# Altium footprint library base.PcbLib: 116 footprints (part 2 of 8)
Each footprint in its own frame and in the unit in brackets; x right, y up, seen from the top. Pads: shape width x height; smd on the part's side, far side on the other; paste and mask are expansions set on the pad; w line width, h text height; cw(c..) or ccw(c..) is an arc to the next point about the centre after c.
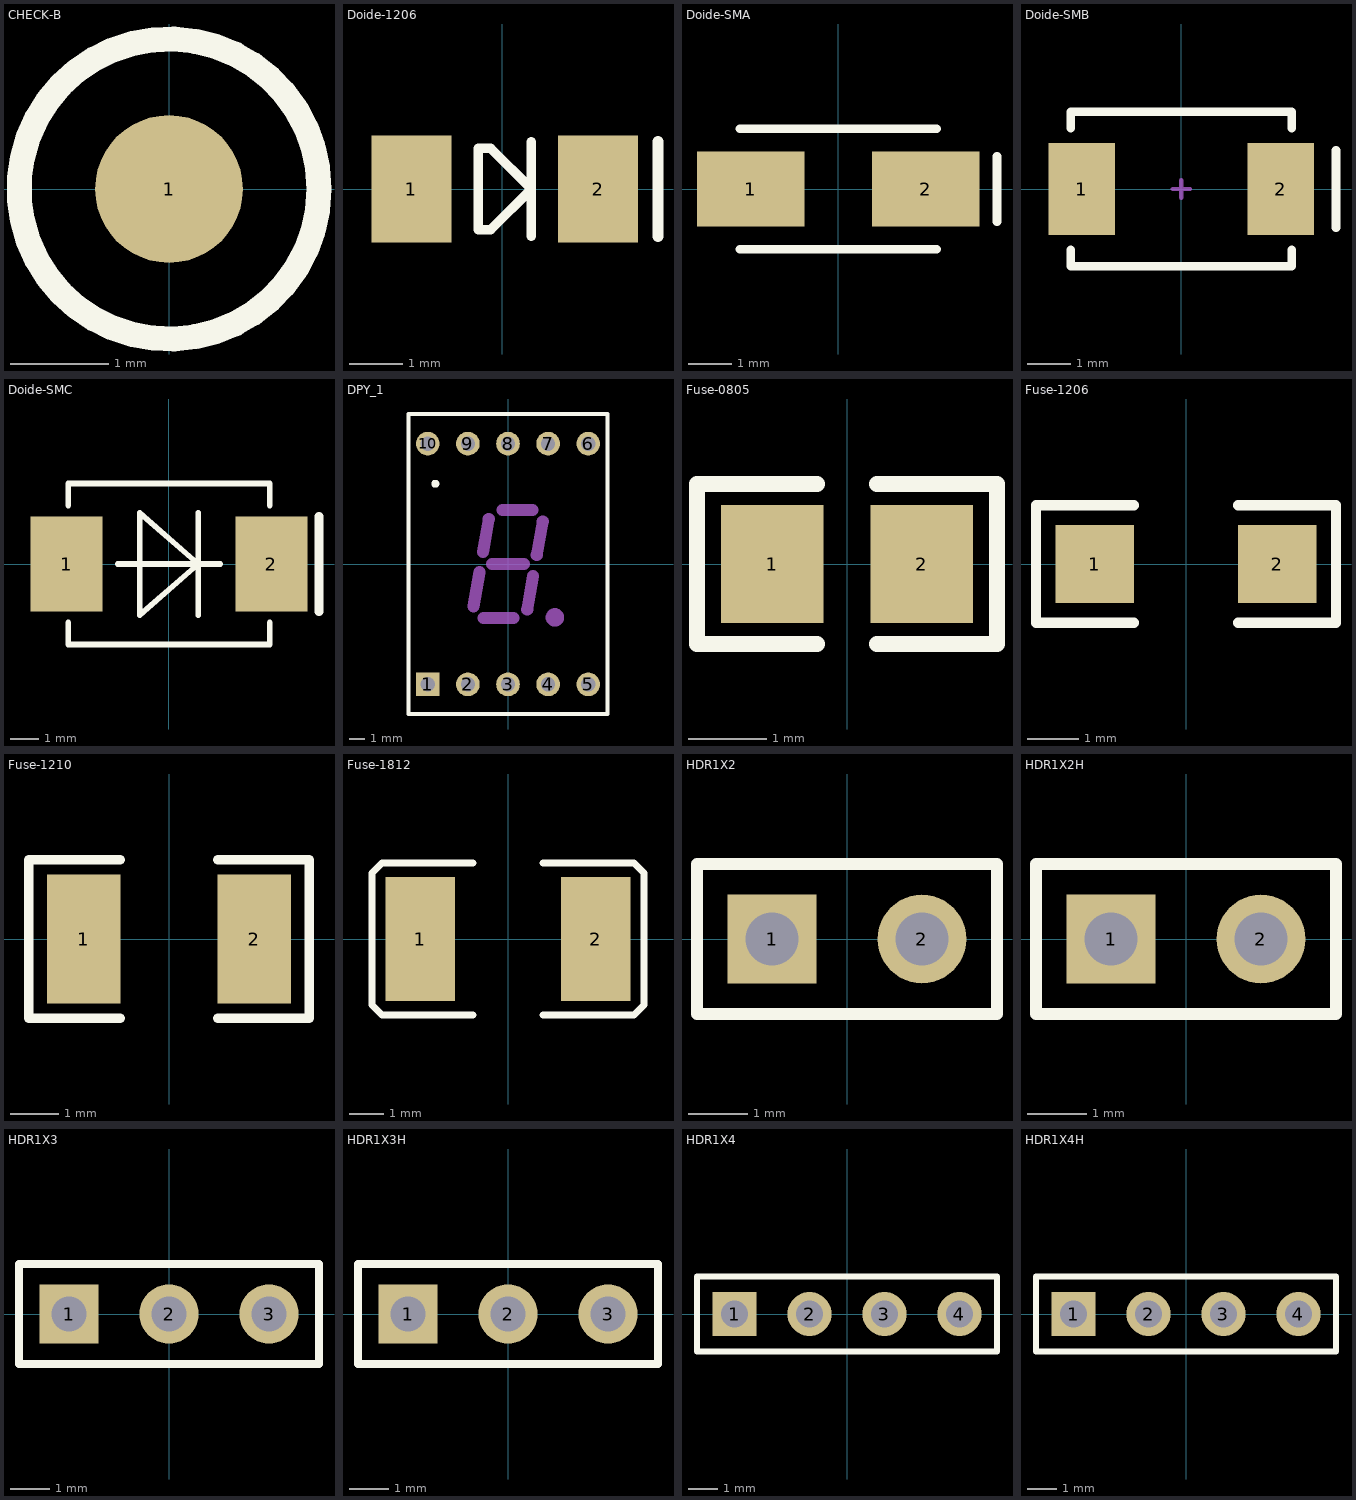
[diagram p1: the footprints below, top view; thin cyan lines are the x and y axes]

## CHECK-B [mm] "测试点"
height 1.45
pads (1):
  round 1.5 smd: 1(0,0)
Top Overlay:
  circle w0.254: c0,0 r1.524

## Doide-1206 [mm] "贴片二极管"
height 3
pads (2):
  rect 1.5x2 smd: 1(-1.702,0) 2(1.798,0)
Top Overlay:
  lines w0.178: 0.548,-0.889 0.548,0.889 ; -0.452,-0.762 -0.214,-0.762 0.548,0 -0.214,0.762 -0.452,0.762 -0.452,-0.762
  lines w0.2: 2.921,-0.889 2.921,0.889
3D body "DIOMELF3515N.STEP": height 1.49, standoff -0.02, extent -1.702,-0.75 1.798,0.75

## Doide-SMA [mm] "贴片二极管"
height 2.54
pads (2):
  rect 2.5x1.75 smd: 1(-2.032,0) 2(2.032,0)
Top Overlay:
  lines w0.2: -2.286,-1.397 2.286,-1.397 ; -2.286,1.397 2.286,1.397 ; 3.683,-0.762 3.683,0.762
3D body "DO214 SMA.STEP": height 2.27, standoff -0.01, extent -2.743,-1.397 2.743,1.397

## Doide-SMB [mil] "DO-214-AA/SMB;"
height 100
pads (2):
  rect 60x83 smd: 1(-90,0) 2(90,0)
Top Overlay:
  lines w7.87: -100,-55 -100,-70 100,-70 100,-55 ; -100,55 -100,70 100,70 100,55 ; 140,-35 140,35
Mechanical 15:
  lines w3.94: -7.87,0 7.87,0 ; 0,-7.87 0,7.87
3D body "DO214 SMB.STEP": height 89.86, standoff -0.79, extent -106.14,-71.27 106.46,70.46

## Doide-SMC [mm] "贴片二极管"
height 1.5
pads (2):
  rect 2.5x3.3 smd: 1(-3.556,0) 2(3.556,0)
Top Overlay:
  lines w0.2: -3.5,-2.032 -3.5,-2.794 3.5,-2.794 3.5,-2.032 ; -3.5,2.032 -3.5,2.794 3.5,2.794 3.5,2.032 ; -1.778,0 1.778,0 ; 1.016,-1.778 1.016,1.778 ; -1.016,-1.778 -1.016,1.778 1.016,0 -1.016,-1.778
  lines w0.3: 5.207,-1.651 5.207,1.651
3D body "DO214 SMC.STEP": height 2.3, standoff 0, extent -3.975,-2.95 3.975,2.95

## DPY_1 [mm]
height 6.34
pads (10):
  rect 1.5x1.5 hole 0.9: 1(-5.08,-7.62)
  round 1.5 hole 0.9: 2(-2.54,-7.62) 3(0,-7.62) 4(2.54,-7.62) 5(5.08,-7.62) 6(5.08,7.62) 7(2.54,7.62) 8(0,7.62) 9(-2.54,7.62) 10(-5.08,7.62)
Top Overlay:
  circle w0.25: c-4.6,5.08 r0.125
  lines w0.254: -6.3,-9.5 6.3,-9.5 6.3,9.5 -6.3,9.5 -6.3,-9.5
Mechanical 1:
  circle w0.86: c2.97,-3.38 r0.15
  lines w0.762: -2.19,-2.69 -1.81,-0.52 ; -1.58,0.76 -1.22,2.84 ; -1.56,-3.43 0.36,-3.43 ; -1.004,0 1.004,0 ; -0.34,3.43 1.55,3.43 ; 1.22,-2.89 1.59,-0.76 ; 1.82,0.56 2.2,2.69

## Fuse-0805 [mm]
height 1.1
pads (2):
  rect 1.3x1.5 smd: 1(-0.95,0) 2(0.95,0)
Top Overlay:
  lines w0.2: -0.381,-1.016 -1.905,-1.016 -1.905,1.016 -0.381,1.016 ; 0.381,-1.016 1.905,-1.016 1.905,1.016 0.381,1.016
3D body "Fuse 0805.STEP": height 1.24, standoff 0, extent -1.105,-0.737 1.105,0.762

## Fuse-1206 [mil]
height 59.06
pads (2):
  rect 60x60 smd: 1(-70,0) 2(70,0)
Top Overlay:
  lines w7.87: -40,-45 -115,-45 -115,45 -40,45 ; 40,-45 115,-45 115,45 40,45
3D body "Fuse-1206.STEP": height 39.41, standoff -0.04, extent -63.03,-32.52 63.03,32.52

## Fuse-1210 [mil]
height 59.06
pads (2):
  rect 60x106.3 smd: 1(-70,0) 2(70,0)
Top Overlay:
  lines w7.87: -40,-65 -115,-65 -115,65 -40,65 ; 40,-65 115,-65 115,65 40,65
3D body "Fuse1210.STEP": height 26.57, standoff 0, extent -63.28,-50.68 63.29,50.69

## Fuse-1812 [mm]
height 1
pads (2):
  rect 2x3.6 smd: 1(-2.54,0) 2(2.54,0)
Top Overlay:
  lines w0.2: -1.016,-2.2 -3.642,-2.2 -3.937,-1.905 -3.937,1.905 -3.642,2.2 -1.016,2.2 ; 1.016,-2.2 3.642,-2.2 3.937,-1.905 3.937,1.905 3.642,2.2 1.016,2.2
3D body "Fuse 1812.STEP": height 1.03, standoff 0, extent -2.37,-1.74 2.365,1.74

## HDR1X2 [mm] "Connector; Header; 2 Position"
pads (2):
  rect 1.5x1.5 hole 0.9: 1(-1.27,0)
  round 1.5 hole 0.9: 2(1.27,0)
Top Overlay:
  lines w0.2: -2.54,-1.27 2.54,-1.27 2.54,1.27 -2.54,1.27 -2.54,-1.27
3D body "HEADER 2.STEP": height 10.1, standoff -1.5, extent -2.54,-1.27 2.54,1.27

## HDR1X2H [mm] "Connector; Header; 2 Position; Right Angle"
pads (2):
  rect 1.5x1.5 hole 0.9: 1(-1.27,0)
  round 1.5 hole 0.9: 2(1.27,0)
Top Overlay:
  lines w0.2: -2.54,-1.27 2.54,-1.27 2.54,1.27 -2.54,1.27 -2.54,-1.27
3D body "HEADER 2H.STEP": height 4.33, standoff -3, extent -2.54,-1.27 2.54,7

## HDR1X3 [mm] "Connector; Header; 3 Position"
pads (3):
  rect 1.5x1.5 hole 0.9: 1(-2.54,0)
  round 1.5 hole 0.9: 2(0,0) 3(2.54,0)
Top Overlay:
  lines w0.2: -3.81,-1.27 -3.81,1.27 3.81,1.27 3.81,-1.27 -3.81,-1.27
3D body "HEADER 3.STEP": height 10.1, standoff -1.5, extent -3.81,-1.27 3.81,1.27

## HDR1X3H [mm] "Connector; Header; 3 Position; Right Angle"
pads (3):
  rect 1.5x1.5 hole 0.9: 1(-2.54,0)
  round 1.5 hole 0.9: 2(0,0) 3(2.54,0)
Top Overlay:
  lines w0.2: -3.81,-1.27 -3.81,1.27 3.81,1.27 3.81,-1.27 -3.81,-1.27
3D body "HEADER 3H.STEP": height 4.33, standoff -3, extent -3.81,-1.27 3.81,7

## HDR1X4 [mm] "Connector; Header; 4 Position"
pads (4):
  rect 1.5x1.5 hole 0.9: 1(-3.81,0)
  round 1.5 hole 0.9: 2(-1.27,0) 3(1.27,0) 4(3.81,0)
Top Overlay:
  lines w0.2: -5.08,-1.27 5.08,-1.27 5.08,1.27 -5.08,1.27 -5.08,-1.27
3D body "HEADER 4.STEP": height 10.1, standoff -1.5, extent -5.08,-1.27 5.08,1.27

## HDR1X4H [mm] "Connector; Header; 4 Position; Right Angle"
pads (4):
  rect 1.5x1.5 hole 0.9: 1(-3.81,0)
  round 1.5 hole 0.9: 2(-1.27,0) 3(1.27,0) 4(3.81,0)
Top Overlay:
  lines w0.2: -5.08,-1.27 -5.08,1.27 5.08,1.27 5.08,-1.27 -5.08,-1.27
3D body "HEADER 4H.STEP": height 4.33, standoff -3, extent -5.08,-1.27 5.08,7